# Altium footprint library PVV.PcbLib: 88 footprints (part 2 of 6)
Each footprint in its own frame and in the unit in brackets; x right, y up, seen from the top. Pads: shape width x height; smd on the part's side, far side on the other; paste and mask are expansions set on the pad; w line width, h text height; cw(c..) or ccw(c..) is an arc to the next point about the centre after c.
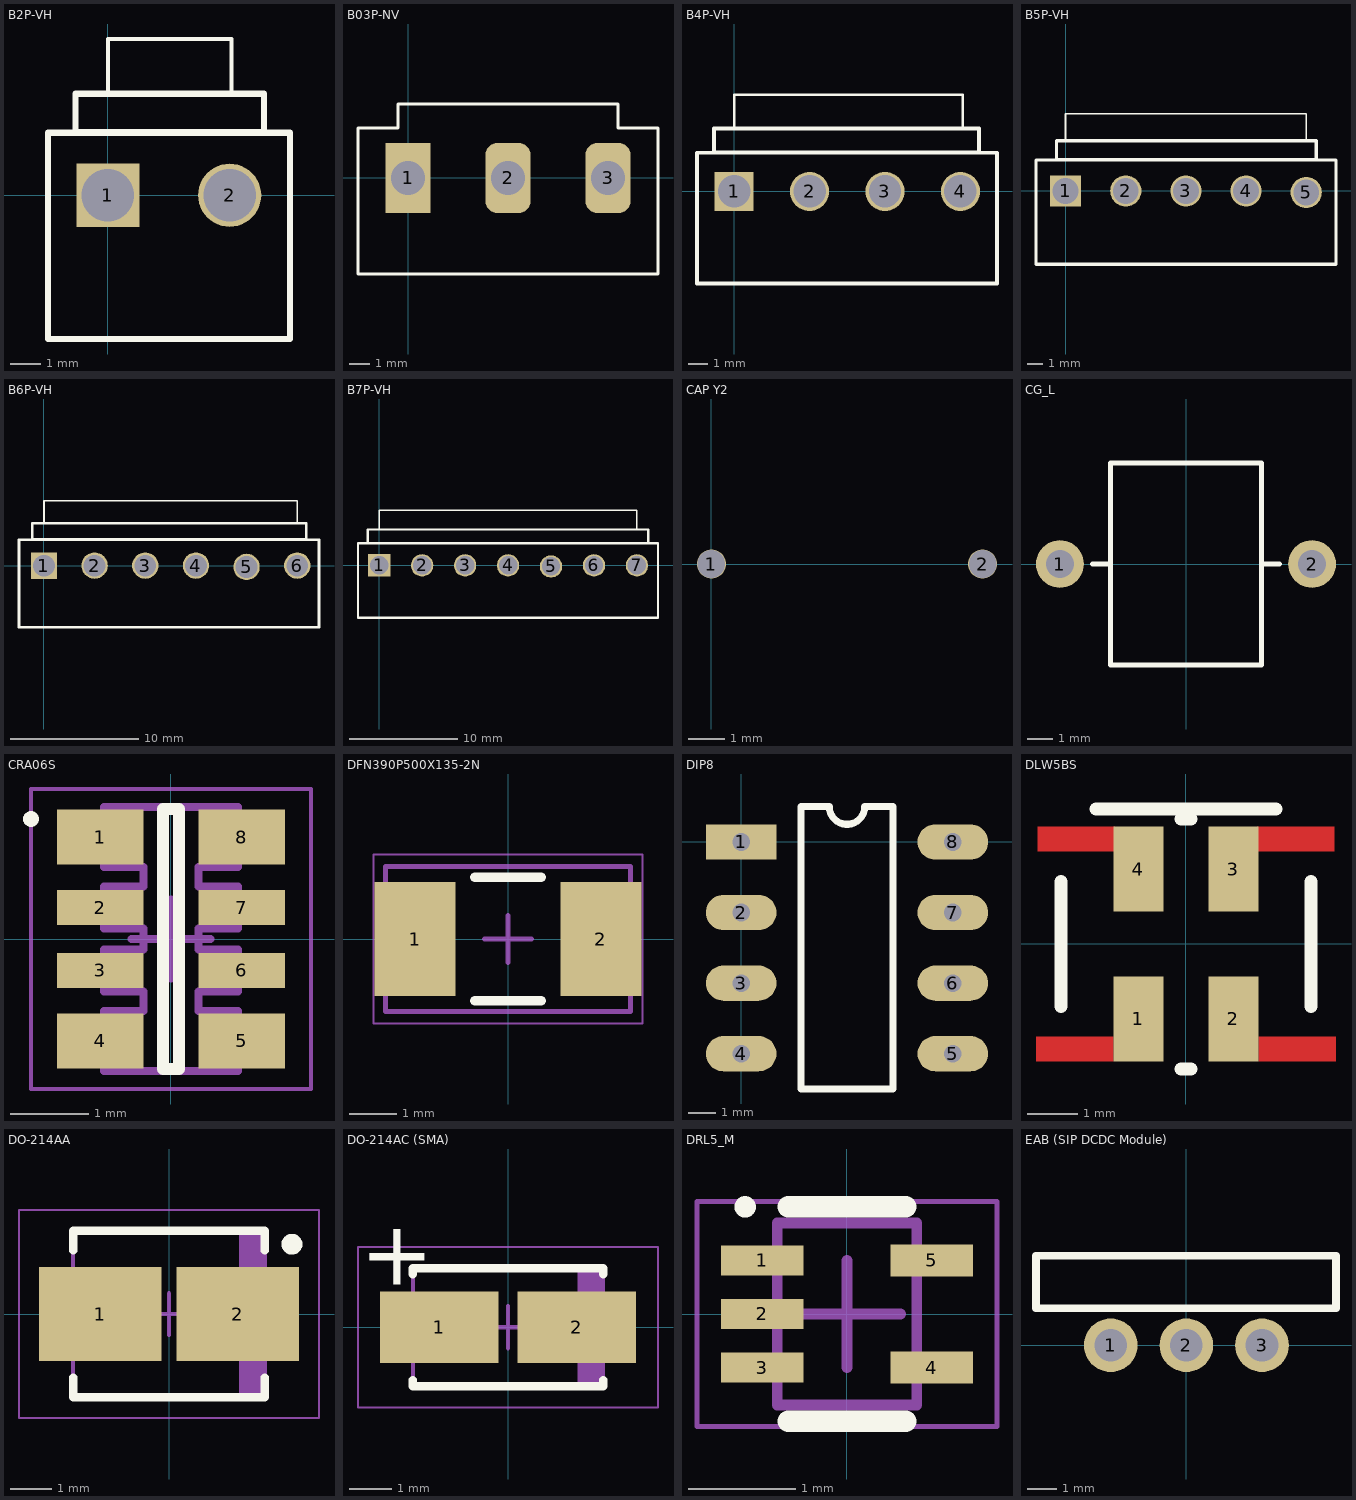
[diagram p1: the footprints below, top view; thin cyan lines are the x and y axes]

## B2P-VH [mm]
pads (2):
  rect 2.057x2.057 / inner round 0 / far side rect 2.057x2.057 hole 1.7 mask+0.128: 1(0,0)
  round 2.057 / inner round 0 / far side round 2.057 hole 1.7 mask+0.128: 2(3.96,0)
Top Overlay:
  lines w0.127: 0,3.302 4.025,3.302 4.025,5.08 0,5.08 0,3.302
  lines w0.203: -1.95,-4.675 -1.95,2.032 5.925,2.032 5.925,-4.675 -1.95,-4.675 ; -1.05,2.05 5.075,2.05 5.075,3.302 -1.05,3.302 -1.05,2.05
3D body "User Library-B2P-VH.STEP": height 10.91, standoff -3.69, extent -1.95,-4.6 5.91,3.9

## B03P-NV [mm]
pads (3):
  rect 2.25x3.5 hole 1.7: 1(0,0)
  rrect50% 2.25x3.5 hole 1.7: 2(5,0) 3(10,0)
Top Overlay:
  lines w0.152: -2.5,-4.8 12.5,-4.8 12.5,2.5 10.5,2.5 10.5,3.7 -0.5,3.7 -0.5,2.5 -2.5,2.5 -2.5,-4.8
3D body "B03P-NV.STEP": height 2.1, standoff -12.5, extent -2.5,-4.8 12.5,3.7

## B4P-VH [mm]
pads (4):
  rect 2.057x2.057 / inner round 0 / far side rect 2.057x2.057 hole 1.7 mask+0.128: 1(0,0)
  round 2.057 / inner round 0 / far side round 2.057 hole 1.7 mask+0.128: 2(3.96,0) 3(7.92,0) 4(11.88,0)
Top Overlay:
  lines w0.127: 0,3.302 0,5.08 12,5.08 12,3.302 0,3.302
  lines w0.203: -1.95,-4.826 13.8,-4.826 13.8,2.032 -1.95,2.032 -1.95,-4.826 ; -1.05,2.05 -1.05,3.302 12.85,3.302 12.85,2.05 -1.05,2.05
3D body "B4P-VH.STEP": height 10.93, standoff -3.67, extent -1.946,-4.783 13.834,3.717

## B5P-VH [mm]
pads (5):
  rect 2.057x2.057 / inner round 0 / far side rect 2.057x2.057 hole 1.7 mask+0.128: 1(0,0)
  round 2.057 / inner round 0 / far side round 2.057 hole 1.7 mask+0.128: 2(3.96,0) 3(7.92,0) 4(11.88,0) 5(15.84,-0.1)
Top Overlay:
  lines w0.127: 0,3.302 15.84,3.302 15.84,5.08 0,5.08 0,3.302
  lines w0.203: -1.95,-4.826 -1.95,2.032 17.8,2.032 17.8,-4.826 -1.95,-4.826 ; -0.6,2.05 16.5,2.05 16.5,3.302 -0.6,3.302 -0.6,2.05
3D body "User Library-B5P-VH.STEP": height 10.92, standoff -3.68, extent -1.95,-4.6 17.79,3.9

## B6P-VH [mm]
pads (6):
  rect 2.057x2.057 / inner round 0 / far side rect 2.057x2.057 hole 1.7 mask+0.128: 1(0,0)
  round 2.057 / inner round 0 / far side round 2.057 hole 1.7 mask+0.128: 2(3.96,0) 3(7.92,0) 4(11.88,0) 5(15.84,-0.1) 6(19.8,0)
Top Overlay:
  lines w0.127: 0,3.302 19.8,3.302 19.8,5.08 0,5.08 0,3.302
  lines w0.203: -1.95,-4.826 -1.95,2.032 21.5,2.032 21.5,-4.826 -1.95,-4.826 ; -0.9,2.05 20.5,2.05 20.5,3.302 -0.9,3.302 -0.9,2.05
3D body "User Library-user_library-b6p-vh_asm.STEP": height 10.92, standoff -3.68, extent -1.95,-4.6 21.48,3.9

## B7P-VH [mm]
pads (7):
  rect 2.057x2.057 / inner round 0 / far side rect 2.057x2.057 hole 1.7 mask+0.128: 1(0,0)
  round 2.057 / inner round 0 / far side round 2.057 hole 1.7 mask+0.128: 2(3.96,0) 3(7.92,0) 4(11.88,0) 5(15.84,-0.1) 6(19.8,0) 7(23.76,0)
Top Overlay:
  lines w0.127: 0,3.302 23.76,3.302 23.76,5.08 0,5.08 0,3.302
  lines w0.203: -1.95,-4.826 -1.95,2.032 25.7,2.032 25.7,-4.826 -1.95,-4.826 ; -1.05,2.05 24.8,2.05 24.8,3.302 -1.05,3.302 -1.05,2.05
3D body "User Library-JST B7P-VH.STEP": height 10.92, standoff -3.68, extent -1.95,-4.8 25.71,3.7

## CAP Y2 [mm] "D=5mm LS=7.5mm"
pads (2):
  round 0.8 hole 0.762: 1(0,0) 2(7.5,0)
3D body "C947U472MZVDBA7317.stp": height 15.5, standoff -3.3, extent -1.749,-2.502 9.25,2.5

## CG_L [mm]
height 10
pads (2):
  round 1.9 hole 1.1: 1(-5,0) 2(5,0)
Top Overlay:
  lines w0.203: -3.7,0 -3,0 ; 3,0 3.7,0 ; -3,-4 3,-4 3,4 -3,4 -3,-4
3D body "CG_L.stp": height 9.55, standoff -2.51, extent -5.4,-4.05 5.4,4.05

## CRA06S [mm] "Chip Array, ConvexS, 8-Leads, Pitch 0,80mm,  Body 3,20x1,50mm,  IPC Low Density"
height 0.6
pads (8):
  rect 1.1x0.7 smd: 1(-0.9,1.295) 4(-0.9,-1.295) 5(0.9,-1.295) 8(0.9,1.295)
  rect 1.1x0.45 smd: 2(-0.9,0.4) 3(-0.9,-0.4) 6(0.9,-0.4) 7(0.9,0.4)
Top Overlay:
  circle w0.1: c-1.778,1.524 r0.05
  lines w0.152: -0.102,-1.651 -0.102,1.651 0.102,1.651 0.102,-1.651 -0.102,-1.651
Mechanical 13:
  lines w0.1: -0.85,-1.675 -0.85,-0.915 -0.35,-0.915 -0.35,-0.665 -0.85,-0.665 -0.85,-0.135 -0.35,-0.135 -0.35,0.135 -0.85,0.135 -0.85,0.665 -0.35,0.665 -0.35,0.915 -0.85,0.915 -0.85,1.675 0.85,1.675 0.85,0.915 0.35,0.915 0.35,0.665 0.85,0.665 0.85,0.135 0.35,0.135 0.35,-0.135 0.85,-0.135 0.85,-0.665 0.35,-0.665 0.35,-0.915 0.85,-0.915 0.85,-1.675 -0.85,-1.675
Mechanical 15:
  lines w0.05: -1.778,-1.905 -1.778,1.905 1.778,1.905 1.778,-1.905 -1.778,-1.905
  lines w0.1: -0.5,0 0.5,0 ; 0,-0.5 0,0.5
3D body "CAC-80P319X150-8M.step": height 0.6, standoff 0, extent -0.875,-1.675 0.875,1.675

## DFN390P500X135-2N [mm] "DFN, 2-Leads, Body 3,20x5,00mm, Pitch 3,90mm, Quartz Crystal"
height 1.35
pads (2):
  rect 1.7x2.4 smd: 1(-1.95,0) 2(1.95,0)
Top Overlay:
  lines w0.2: -0.7,-1.3 0.7,-1.3 ; -0.7,1.3 0.7,1.3
Mechanical 13:
  lines w0.1: -2.575,-1.525 -2.575,1.525 2.575,1.525 2.575,-1.525 -2.575,-1.525
Mechanical 15:
  lines w0.05: -2.825,-1.775 -2.825,1.775 2.825,1.775 2.825,-1.775 -2.825,-1.775
  lines w0.1: -0.5,0 0.5,0 ; 0,-0.5 0,0.5
3D body: height 1.35, standoff 0, extent -2.575,-1.525 2.575,1.525

## DIP8 [mm]
pads (8):
  rect 2.54x1.27 hole 0.635: 1(0,0)
  oval 2.54x1.27 hole 0.635: 2(0,-2.54) 3(0,-5.08) 4(0,-7.62) 5(7.62,-7.62) 6(7.62,-5.08) 7(7.62,-2.54) 8(7.62,0)
Top Overlay:
  lines w0.254: 2.159,-8.89 2.159,1.27 3.175,1.27 ccw(c3.81,1.27) 4.445,1.27 5.461,1.27 5.461,-8.89 2.159,-8.89
3D body "CircuitWorks-DIP8.step": height 4.19, standoff -2.67, extent -0.127,-9.525 7.747,1.905

## DLW5BS [mm] "Common Mode Coil"
pads (4):
  rect 1x1.7 smd: 1(-0.95,-1.5) 2(0.95,-1.5) 3(0.95,1.5) 4(-0.95,1.5)
Top Layer:
  rectangle: -3,-2.35 -1.45,-1.85
  rectangle: 1.45,-2.35 3,-1.85
  rectangle: 1.425,1.85 2.975,2.35
  rectangle: -2.975,1.85 -1.425,2.35
Top Overlay:
  lines w0.254: -2.5,-1.25 -2.5,1.25 ; -1.8,2.7 1.8,2.7 ; -0.1,-2.5 0.1,-2.5 ; -0.1,2.5 0.1,2.5 ; 2.5,-1.25 2.5,1.25
3D body "User Library-DLW5BT.STEP": height 2.46, standoff 0.01, extent -2.5,-2.5 2.5,2.5

## DO-214AA [mm] "Molded Diode, 2-Leads, Body 4,32x3,63mm, IPC Low Density"
height 2.3
pads (2):
  rect 2.95x2.25 smd: 1(-1.65,0) 2(1.65,0)
Top Overlay:
  circle w0.25: c2.95,1.675 r0.125
  lines w0.2: -2.3,-1.525 -2.3,-2 2.3,-2 2.3,-1.525 ; -2.3,1.525 -2.3,2 2.3,2 2.3,1.525
Mechanical 13:
  rectangle: 1.681,-1.975 2.3,1.975
  lines w0.1: -2.3,-1.975 -2.3,1.975 2.3,1.975 2.3,-1.975 -2.3,-1.975
Mechanical 15:
  lines w0.05: -3.6,-2.5 -3.6,2.5 3.6,2.5 3.6,-2.5 -3.6,-2.5
  lines w0.1: -0.5,0 0.5,0 ; 0,-0.5 0,0.5
3D body "DO-214AA.step": height 2.3, standoff 0, extent -2.52,-1.975 2.52,1.975

## DO-214AC (SMA) [mm] "Molded Diode, 2-Leads, Body 4,25x2,67mm, IPC Low Density"
height 2.3
pads (2):
  rect 2.8x1.7 smd: 1(-1.625,0) 2(1.625,0)
Top Overlay:
  lines w0.2: -2.25,-1.25 -2.25,-1.4 2.25,-1.4 2.25,-1.25 ; -2.25,1.25 -2.25,1.4 2.25,1.4 2.25,1.25
  text "+" at -3.5,1 h1.52
Mechanical 13:
  rectangle: 1.645,-1.395 2.25,1.395
  lines w0.1: -2.25,-1.395 -2.25,1.395 2.25,1.395 2.25,-1.395 -2.25,-1.395
Mechanical 15:
  lines w0.05: -3.55,-1.9 -3.55,1.9 3.55,1.9 3.55,-1.9 -3.55,-1.9
  lines w0.1: -0.5,0 0.5,0 ; 0,-0.5 0,0.5
3D body "DO-214AC (SMA).step": height 2.3, standoff 0, extent -2.47,-1.395 2.47,1.395

## DRL5_M [mm] "SOTFL, 5-Flat Leads, Body 1.2x1.6x0.6mm, Pitch 0.5mm, IPC Low Density"
height 0.6
pads (5):
  rect 0.77x0.28 smd: 1(-0.79,0.5) 2(-0.79,0) 3(-0.79,-0.5)
  rect 0.77x0.3 smd: 4(0.79,-0.5) 5(0.79,0.5)
Top Overlay:
  circle w0.1: c-0.95,1 r0.05
  lines w0.2: -0.55,-1 0.55,-1 ; -0.55,1 0.55,1
Mechanical 13:
  lines w0.1: -0.65,-0.85 0.65,-0.85 0.65,0.85 -0.65,0.85 -0.65,-0.85
Mechanical 15:
  lines w0.05: -1.4,-1.05 1.4,-1.05 1.4,1.05 -1.4,1.05 -1.4,-1.05
  lines w0.1: -0.5,0 0.5,0 ; 0,-0.5 0,0.5
3D body: height 0.6, standoff 0, extent -0.65,-0.85 0.65,0.85

## EAB (SIP DCDC Module) [mm]
pads (3):
  round 1.8 hole 1.1: 1(-2.54,0) 2(0,0) 3(2.54,0)
Top Overlay:
  lines w0.254: -5.05,1.25 -5.05,3 5.025,3 5.025,1.25 -5.05,1.25
3D body "EAB0003A.stp": height 11.01, standoff -3.99, extent -5,-5.03 5,3.77